# Altium integrated library Weidmueller_OMNIMATE_Signal.IntLib: 2550 symbols (part 23 of 45) (continued)
## 1797240000_Single (continued)
OMNIMATE Signal - series BL/SL 5.00; PartNumber: 1797240000; Manufacturer: Weidmueller; Short_text_for_material: SL-SMT 5.00/03/90LF 1.5SN BK BX; Side_termination_characteristic: Solder flange; Mounting_onto_the_PCB: Reflow solder connection; Pitch_mm: 5 mm; Pitch_inch: 0.197 inch; No_of_poles: 3; Outgoing_elbow: 90°; Solder_pin_length_mm: 1.5 mm; Contact_surface: tinned; Insulating_material: LCP GF; UL_94_flammability_rating: V-0; Rated_voltage_for_surge_voltage_class_pollution_degree_II_2: 400 V; Rated_current_min_no_of_poles_TU_20_deg_C: 19 A; Rated_voltage_use_group_B_UL_1059: 300 V; Rated_current_use_group_B_UL_1059: 15 A; PackageReference: SL_SMT_5_00_90LF_03; Colour: Black; Packaging: Box; Qty: 100 PCS; Revision: V1; ComponentLink1Description: Manufacturer URL; ComponentLink1URL: http://www.weidmueller.com/; ComponentLink2Description: URL Link1; ComponentLink2URL: http://catalog.weidmueller.com/catalog/Start.do?localeId=en&ObjectID=1797240000
footprint SL_SMT_5_00_90LF_03 (OMNIMATE Signal - Serie BL/SL 5.00  SL-SMT 5.00/03/90LF 3.2)
part A pins: A1
part B pins: A2
part C pins: A3

## 1797250000
designator J?
OMNIMATE Signal - series BL/SL 5.00; PartNumber: 1797250000; Manufacturer: Weidmueller; Short_text_for_material: SL-SMT 5.00/04/90LF 1.5SN BK BX; Side_termination_characteristic: Solder flange; Mounting_onto_the_PCB: Reflow solder connection; Pitch_mm: 5 mm; Pitch_inch: 0.197 inch; No_of_poles: 4; Outgoing_elbow: 90°; Solder_pin_length_mm: 1.5 mm; Contact_surface: tinned; Insulating_material: LCP GF; UL_94_flammability_rating: V-0; Rated_voltage_for_surge_voltage_class_pollution_degree_II_2: 400 V; Rated_current_min_no_of_poles_TU_20_deg_C: 19 A; Rated_voltage_use_group_B_UL_1059: 300 V; Rated_current_use_group_B_UL_1059: 15 A; PackageReference: SL_SMT_5_00_90LF_04; Colour: Black; Packaging: Box; Qty: 100 PCS; Revision: V1; ComponentLink1Description: Manufacturer URL; ComponentLink1URL: http://www.weidmueller.com/; ComponentLink2Description: URL Link1; ComponentLink2URL: http://catalog.weidmueller.com/catalog/Start.do?localeId=en&ObjectID=1797250000
footprint SL_SMT_5_00_90LF_04 (OMNIMATE Signal - Serie BL/SL 5.00  SL-SMT 5.00/04/90LF 3.2)
pins: A1, A2, A3, A4

## 1797250000_Single
designator J?
OMNIMATE Signal - series BL/SL 5.00; PartNumber: 1797250000; Manufacturer: Weidmueller; Short_text_for_material: SL-SMT 5.00/04/90LF 1.5SN BK BX; Side_termination_characteristic: Solder flange; Mounting_onto_the_PCB: Reflow solder connection; Pitch_mm: 5 mm; Pitch_inch: 0.197 inch; No_of_poles: 4; Outgoing_elbow: 90°; Solder_pin_length_mm: 1.5 mm; Contact_surface: tinned; Insulating_material: LCP GF; UL_94_flammability_rating: V-0; Rated_voltage_for_surge_voltage_class_pollution_degree_II_2: 400 V; Rated_current_min_no_of_poles_TU_20_deg_C: 19 A; Rated_voltage_use_group_B_UL_1059: 300 V; Rated_current_use_group_B_UL_1059: 15 A; PackageReference: SL_SMT_5_00_90LF_04; Colour: Black; Packaging: Box; Qty: 100 PCS; Revision: V1; ComponentLink1Description: Manufacturer URL; ComponentLink1URL: http://www.weidmueller.com/; ComponentLink2Description: URL Link1; ComponentLink2URL: http://catalog.weidmueller.com/catalog/Start.do?localeId=en&ObjectID=1797250000
footprint SL_SMT_5_00_90LF_04 (OMNIMATE Signal - Serie BL/SL 5.00  SL-SMT 5.00/04/90LF 3.2)
part A pins: A1
part B pins: A2
part C pins: A3
part D pins: A4

## 1797290000
designator J?
OMNIMATE Signal - series BL/SL 5.00; PartNumber: 1797290000; Manufacturer: Weidmueller; Short_text_for_material: SL-SMT 5.00/08/90LF 1.5SN BK BX; Side_termination_characteristic: Solder flange; Mounting_onto_the_PCB: Reflow solder connection; Pitch_mm: 5 mm; Pitch_inch: 0.197 inch; No_of_poles: 8; Outgoing_elbow: 90°; Solder_pin_length_mm: 1.5 mm; Contact_surface: tinned; Insulating_material: LCP GF; UL_94_flammability_rating: V-0; Rated_voltage_for_surge_voltage_class_pollution_degree_II_2: 400 V; Rated_current_min_no_of_poles_TU_20_deg_C: 19 A; Rated_voltage_use_group_B_UL_1059: 300 V; Rated_current_use_group_B_UL_1059: 15 A; PackageReference: SL_SMT_5_00_90LF_08; Colour: Black; Packaging: Box; Qty: 50 PCS; Revision: V1; ComponentLink1Description: Manufacturer URL; ComponentLink1URL: http://www.weidmueller.com/; ComponentLink2Description: URL Link1; ComponentLink2URL: http://catalog.weidmueller.com/catalog/Start.do?localeId=en&ObjectID=1797290000
footprint SL_SMT_5_00_90LF_08 (OMNIMATE Signal - Serie BL/SL 5.00  SL-SMT 5.00/08/90LF 3.2)
pins: A1, A2, A3, A4, A5, A6, A7, A8

## 1797290000_Single
designator J?
OMNIMATE Signal - series BL/SL 5.00; PartNumber: 1797290000; Manufacturer: Weidmueller; Short_text_for_material: SL-SMT 5.00/08/90LF 1.5SN BK BX; Side_termination_characteristic: Solder flange; Mounting_onto_the_PCB: Reflow solder connection; Pitch_mm: 5 mm; Pitch_inch: 0.197 inch; No_of_poles: 8; Outgoing_elbow: 90°; Solder_pin_length_mm: 1.5 mm; Contact_surface: tinned; Insulating_material: LCP GF; UL_94_flammability_rating: V-0; Rated_voltage_for_surge_voltage_class_pollution_degree_II_2: 400 V; Rated_current_min_no_of_poles_TU_20_deg_C: 19 A; Rated_voltage_use_group_B_UL_1059: 300 V; Rated_current_use_group_B_UL_1059: 15 A; PackageReference: SL_SMT_5_00_90LF_08; Colour: Black; Packaging: Box; Qty: 50 PCS; Revision: V1; ComponentLink1Description: Manufacturer URL; ComponentLink1URL: http://www.weidmueller.com/; ComponentLink2Description: URL Link1; ComponentLink2URL: http://catalog.weidmueller.com/catalog/Start.do?localeId=en&ObjectID=1797290000
footprint SL_SMT_5_00_90LF_08 (OMNIMATE Signal - Serie BL/SL 5.00  SL-SMT 5.00/08/90LF 3.2)
part A pins: A1
part B pins: A2
part C pins: A3
part D pins: A4
part E pins: A5
part F pins: A6
part G pins: A7
part H pins: A8

## 1797620000
designator J?
OMNIMATE Signal - series BL/SL 5.00; PartNumber: 1797620000; Manufacturer: Weidmueller; Short_text_for_material: SL-SMT 5.00/02/90 1.5SN BK RL; Side_termination_characteristic: open side; Mounting_onto_the_PCB: Reflow solder connection; Pitch_mm: 5 mm; Pitch_inch: 0.197 inch; No_of_poles: 2; Outgoing_elbow: 90°; Solder_pin_length_mm: 1.5 mm; Contact_surface: tinned; Insulating_material: LCP GF; UL_94_flammability_rating: V-0; Rated_voltage_for_surge_voltage_class_pollution_degree_II_2: 400 V; Rated_current_min_no_of_poles_TU_20_deg_C: 19 A; Rated_voltage_use_group_B_UL_1059: 300 V; Rated_current_use_group_B_UL_1059: 15 A; PackageReference: SL_SMT_5_00_90_02; Colour: Black; Packaging: Tape; Qty: 350 PCS; Revision: V1; ComponentLink1Description: Manufacturer URL; ComponentLink1URL: http://www.weidmueller.com/; ComponentLink2Description: URL Link1; ComponentLink2URL: http://catalog.weidmueller.com/catalog/Start.do?localeId=en&ObjectID=1797620000
footprint SL_SMT_5_00_90_02 (OMNIMATE Signal - Serie BL/SL 5.00  SL-SMT 5.00/02/90 3.2)
pins: A1, A2

## 1797620000_Single
designator J?
OMNIMATE Signal - series BL/SL 5.00; PartNumber: 1797620000; Manufacturer: Weidmueller; Short_text_for_material: SL-SMT 5.00/02/90 1.5SN BK RL; Side_termination_characteristic: open side; Mounting_onto_the_PCB: Reflow solder connection; Pitch_mm: 5 mm; Pitch_inch: 0.197 inch; No_of_poles: 2; Outgoing_elbow: 90°; Solder_pin_length_mm: 1.5 mm; Contact_surface: tinned; Insulating_material: LCP GF; UL_94_flammability_rating: V-0; Rated_voltage_for_surge_voltage_class_pollution_degree_II_2: 400 V; Rated_current_min_no_of_poles_TU_20_deg_C: 19 A; Rated_voltage_use_group_B_UL_1059: 300 V; Rated_current_use_group_B_UL_1059: 15 A; PackageReference: SL_SMT_5_00_90_02; Colour: Black; Packaging: Tape; Qty: 350 PCS; Revision: V1; ComponentLink1Description: Manufacturer URL; ComponentLink1URL: http://www.weidmueller.com/; ComponentLink2Description: URL Link1; ComponentLink2URL: http://catalog.weidmueller.com/catalog/Start.do?localeId=en&ObjectID=1797620000
footprint SL_SMT_5_00_90_02 (OMNIMATE Signal - Serie BL/SL 5.00  SL-SMT 5.00/02/90 3.2)
part A pins: A1
part B pins: A2

## 1797630000
designator J?
OMNIMATE Signal - series BL/SL 5.00; PartNumber: 1797630000; Manufacturer: Weidmueller; Short_text_for_material: SL-SMT 5.00/03/90 1.5SN BK RL; Side_termination_characteristic: open side; Mounting_onto_the_PCB: Reflow solder connection; Pitch_mm: 5 mm; Pitch_inch: 0.197 inch; No_of_poles: 3; Outgoing_elbow: 90°; Solder_pin_length_mm: 1.5 mm; Contact_surface: tinned; Insulating_material: LCP GF; UL_94_flammability_rating: V-0; Rated_voltage_for_surge_voltage_class_pollution_degree_II_2: 400 V; Rated_current_min_no_of_poles_TU_20_deg_C: 19 A; Rated_voltage_use_group_B_UL_1059: 300 V; Rated_current_use_group_B_UL_1059: 15 A; PackageReference: SL_SMT_5_00_90_03; Colour: Black; Packaging: Tape; Qty: 350 PCS; Revision: V1; ComponentLink1Description: Manufacturer URL; ComponentLink1URL: http://www.weidmueller.com/; ComponentLink2Description: URL Link1; ComponentLink2URL: http://catalog.weidmueller.com/catalog/Start.do?localeId=en&ObjectID=1797630000
footprint SL_SMT_5_00_90_03 (OMNIMATE Signal - Serie BL/SL 5.00  SL-SMT 5.00/03/90 3.2)
pins: A1, A2, A3

## 1797630000_Single
designator J?
OMNIMATE Signal - series BL/SL 5.00; PartNumber: 1797630000; Manufacturer: Weidmueller; Short_text_for_material: SL-SMT 5.00/03/90 1.5SN BK RL; Side_termination_characteristic: open side; Mounting_onto_the_PCB: Reflow solder connection; Pitch_mm: 5 mm; Pitch_inch: 0.197 inch; No_of_poles: 3; Outgoing_elbow: 90°; Solder_pin_length_mm: 1.5 mm; Contact_surface: tinned; Insulating_material: LCP GF; UL_94_flammability_rating: V-0; Rated_voltage_for_surge_voltage_class_pollution_degree_II_2: 400 V; Rated_current_min_no_of_poles_TU_20_deg_C: 19 A; Rated_voltage_use_group_B_UL_1059: 300 V; Rated_current_use_group_B_UL_1059: 15 A; PackageReference: SL_SMT_5_00_90_03; Colour: Black; Packaging: Tape; Qty: 350 PCS; Revision: V1; ComponentLink1Description: Manufacturer URL; ComponentLink1URL: http://www.weidmueller.com/; ComponentLink2Description: URL Link1; ComponentLink2URL: http://catalog.weidmueller.com/catalog/Start.do?localeId=en&ObjectID=1797630000
footprint SL_SMT_5_00_90_03 (OMNIMATE Signal - Serie BL/SL 5.00  SL-SMT 5.00/03/90 3.2)
part A pins: A1
part B pins: A2
part C pins: A3

## 1797640000
designator J?
OMNIMATE Signal - series BL/SL 5.00; PartNumber: 1797640000; Manufacturer: Weidmueller; Short_text_for_material: SL-SMT 5.00/04/90 1.5SN BK RL; Side_termination_characteristic: open side; Mounting_onto_the_PCB: Reflow solder connection; Pitch_mm: 5 mm; Pitch_inch: 0.197 inch; No_of_poles: 4; Outgoing_elbow: 90°; Solder_pin_length_mm: 1.5 mm; Contact_surface: tinned; Insulating_material: LCP GF; UL_94_flammability_rating: V-0; Rated_voltage_for_surge_voltage_class_pollution_degree_II_2: 400 V; Rated_current_min_no_of_poles_TU_20_deg_C: 19 A; Rated_voltage_use_group_B_UL_1059: 300 V; Rated_current_use_group_B_UL_1059: 15 A; PackageReference: SL_SMT_5_00_90_04; Colour: Black; Packaging: Tape; Qty: 350 PCS; Revision: V1; ComponentLink1Description: Manufacturer URL; ComponentLink1URL: http://www.weidmueller.com/; ComponentLink2Description: URL Link1; ComponentLink2URL: http://catalog.weidmueller.com/catalog/Start.do?localeId=en&ObjectID=1797640000
footprint SL_SMT_5_00_90_04 (OMNIMATE Signal - Serie BL/SL 5.00  SL-SMT 5.00/04/90 3.2)
pins: A1, A2, A3, A4

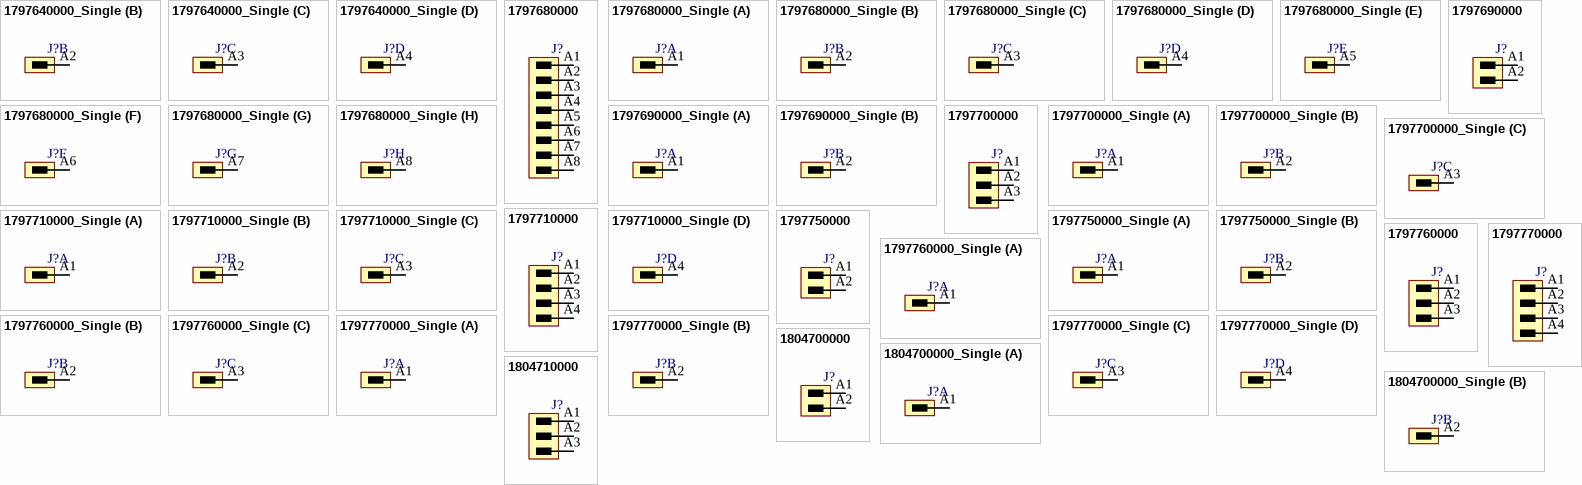
[diagram p124: symbols 1797640000_Single to 1804710000]

## 1797640000_Single
designator J?
OMNIMATE Signal - series BL/SL 5.00; PartNumber: 1797640000; Manufacturer: Weidmueller; Short_text_for_material: SL-SMT 5.00/04/90 1.5SN BK RL; Side_termination_characteristic: open side; Mounting_onto_the_PCB: Reflow solder connection; Pitch_mm: 5 mm; Pitch_inch: 0.197 inch; No_of_poles: 4; Outgoing_elbow: 90°; Solder_pin_length_mm: 1.5 mm; Contact_surface: tinned; Insulating_material: LCP GF; UL_94_flammability_rating: V-0; Rated_voltage_for_surge_voltage_class_pollution_degree_II_2: 400 V; Rated_current_min_no_of_poles_TU_20_deg_C: 19 A; Rated_voltage_use_group_B_UL_1059: 300 V; Rated_current_use_group_B_UL_1059: 15 A; PackageReference: SL_SMT_5_00_90_04; Colour: Black; Packaging: Tape; Qty: 350 PCS; Revision: V1; ComponentLink1Description: Manufacturer URL; ComponentLink1URL: http://www.weidmueller.com/; ComponentLink2Description: URL Link1; ComponentLink2URL: http://catalog.weidmueller.com/catalog/Start.do?localeId=en&ObjectID=1797640000
footprint SL_SMT_5_00_90_04 (OMNIMATE Signal - Serie BL/SL 5.00  SL-SMT 5.00/04/90 3.2)
part A pins: A1
part B pins: A2
part C pins: A3
part D pins: A4

## 1797680000
designator J?
OMNIMATE Signal - series BL/SL 5.00; PartNumber: 1797680000; Manufacturer: Weidmueller; Short_text_for_material: SL-SMT 5.00/08/90 1.5SN BK RL; Side_termination_characteristic: open side; Mounting_onto_the_PCB: Reflow solder connection; Pitch_mm: 5 mm; Pitch_inch: 0.197 inch; No_of_poles: 8; Outgoing_elbow: 90°; Solder_pin_length_mm: 1.5 mm; Contact_surface: tinned; Insulating_material: LCP GF; UL_94_flammability_rating: V-0; Rated_voltage_for_surge_voltage_class_pollution_degree_II_2: 400 V; Rated_current_min_no_of_poles_TU_20_deg_C: 19 A; Rated_voltage_use_group_B_UL_1059: 300 V; Rated_current_use_group_B_UL_1059: 15 A; PackageReference: SL_SMT_5_00_90_08; Colour: Black; Packaging: Tape; Qty: 350 PCS; Revision: V1; ComponentLink1Description: Manufacturer URL; ComponentLink1URL: http://www.weidmueller.com/; ComponentLink2Description: URL Link1; ComponentLink2URL: http://catalog.weidmueller.com/catalog/Start.do?localeId=en&ObjectID=1797680000
footprint SL_SMT_5_00_90_08 (OMNIMATE Signal - Serie BL/SL 5.00  SL-SMT 5.00/08/90 3.2)
pins: A1, A2, A3, A4, A5, A6, A7, A8

## 1797680000_Single
designator J?
OMNIMATE Signal - series BL/SL 5.00; PartNumber: 1797680000; Manufacturer: Weidmueller; Short_text_for_material: SL-SMT 5.00/08/90 1.5SN BK RL; Side_termination_characteristic: open side; Mounting_onto_the_PCB: Reflow solder connection; Pitch_mm: 5 mm; Pitch_inch: 0.197 inch; No_of_poles: 8; Outgoing_elbow: 90°; Solder_pin_length_mm: 1.5 mm; Contact_surface: tinned; Insulating_material: LCP GF; UL_94_flammability_rating: V-0; Rated_voltage_for_surge_voltage_class_pollution_degree_II_2: 400 V; Rated_current_min_no_of_poles_TU_20_deg_C: 19 A; Rated_voltage_use_group_B_UL_1059: 300 V; Rated_current_use_group_B_UL_1059: 15 A; PackageReference: SL_SMT_5_00_90_08; Colour: Black; Packaging: Tape; Qty: 350 PCS; Revision: V1; ComponentLink1Description: Manufacturer URL; ComponentLink1URL: http://www.weidmueller.com/; ComponentLink2Description: URL Link1; ComponentLink2URL: http://catalog.weidmueller.com/catalog/Start.do?localeId=en&ObjectID=1797680000
footprint SL_SMT_5_00_90_08 (OMNIMATE Signal - Serie BL/SL 5.00  SL-SMT 5.00/08/90 3.2)
part A pins: A1
part B pins: A2
part C pins: A3
part D pins: A4
part E pins: A5
part F pins: A6
part G pins: A7
part H pins: A8

## 1797690000
designator J?
OMNIMATE Signal - series BL/SL 5.00; PartNumber: 1797690000; Manufacturer: Weidmueller; Short_text_for_material: SL-SMT 5.00/02/90G 1.5SN BK RL; Side_termination_characteristic: closed side; Mounting_onto_the_PCB: Reflow solder connection; Pitch_mm: 5 mm; Pitch_inch: 0.197 inch; No_of_poles: 2; Outgoing_elbow: 90°; Solder_pin_length_mm: 1.5 mm; Contact_surface: tinned; Insulating_material: LCP GF; UL_94_flammability_rating: V-0; Rated_voltage_for_surge_voltage_class_pollution_degree_II_2: 400 V; Rated_current_min_no_of_poles_TU_20_deg_C: 19 A; Rated_voltage_use_group_B_UL_1059: 300 V; Rated_current_use_group_B_UL_1059: 15 A; PackageReference: SL_SMT_5_00_90G_02; Colour: Black; Packaging: Tape; Qty: 350 PCS; Revision: V1; ComponentLink1Description: Manufacturer URL; ComponentLink1URL: http://www.weidmueller.com/; ComponentLink2Description: URL Link1; ComponentLink2URL: http://catalog.weidmueller.com/catalog/Start.do?localeId=en&ObjectID=1797690000
footprint SL_SMT_5_00_90G_02 (OMNIMATE Signal - Serie BL/SL 5.00  SL-SMT 5.00/02/90G 3.2)
pins: A1, A2

## 1797690000_Single
designator J?
OMNIMATE Signal - series BL/SL 5.00; PartNumber: 1797690000; Manufacturer: Weidmueller; Short_text_for_material: SL-SMT 5.00/02/90G 1.5SN BK RL; Side_termination_characteristic: closed side; Mounting_onto_the_PCB: Reflow solder connection; Pitch_mm: 5 mm; Pitch_inch: 0.197 inch; No_of_poles: 2; Outgoing_elbow: 90°; Solder_pin_length_mm: 1.5 mm; Contact_surface: tinned; Insulating_material: LCP GF; UL_94_flammability_rating: V-0; Rated_voltage_for_surge_voltage_class_pollution_degree_II_2: 400 V; Rated_current_min_no_of_poles_TU_20_deg_C: 19 A; Rated_voltage_use_group_B_UL_1059: 300 V; Rated_current_use_group_B_UL_1059: 15 A; PackageReference: SL_SMT_5_00_90G_02; Colour: Black; Packaging: Tape; Qty: 350 PCS; Revision: V1; ComponentLink1Description: Manufacturer URL; ComponentLink1URL: http://www.weidmueller.com/; ComponentLink2Description: URL Link1; ComponentLink2URL: http://catalog.weidmueller.com/catalog/Start.do?localeId=en&ObjectID=1797690000
footprint SL_SMT_5_00_90G_02 (OMNIMATE Signal - Serie BL/SL 5.00  SL-SMT 5.00/02/90G 3.2)
part A pins: A1
part B pins: A2

## 1797700000
designator J?
OMNIMATE Signal - series BL/SL 5.00; PartNumber: 1797700000; Manufacturer: Weidmueller; Short_text_for_material: SL-SMT 5.00/03/90G 1.5SN BK RL; Side_termination_characteristic: closed side; Mounting_onto_the_PCB: Reflow solder connection; Pitch_mm: 5 mm; Pitch_inch: 0.197 inch; No_of_poles: 3; Outgoing_elbow: 90°; Solder_pin_length_mm: 1.5 mm; Contact_surface: tinned; Insulating_material: LCP GF; UL_94_flammability_rating: V-0; Rated_voltage_for_surge_voltage_class_pollution_degree_II_2: 400 V; Rated_current_min_no_of_poles_TU_20_deg_C: 19 A; Rated_voltage_use_group_B_UL_1059: 300 V; Rated_current_use_group_B_UL_1059: 15 A; PackageReference: SL_SMT_5_00_90G_03; Colour: Black; Packaging: Tape; Qty: 350 PCS; Revision: V1; ComponentLink1Description: Manufacturer URL; ComponentLink1URL: http://www.weidmueller.com/; ComponentLink2Description: URL Link1; ComponentLink2URL: http://catalog.weidmueller.com/catalog/Start.do?localeId=en&ObjectID=1797700000
footprint SL_SMT_5_00_90G_03 (OMNIMATE Signal - Serie BL/SL 5.00  SL-SMT 5.00/03/90G 3.2)
pins: A1, A2, A3

## 1797700000_Single
designator J?
OMNIMATE Signal - series BL/SL 5.00; PartNumber: 1797700000; Manufacturer: Weidmueller; Short_text_for_material: SL-SMT 5.00/03/90G 1.5SN BK RL; Side_termination_characteristic: closed side; Mounting_onto_the_PCB: Reflow solder connection; Pitch_mm: 5 mm; Pitch_inch: 0.197 inch; No_of_poles: 3; Outgoing_elbow: 90°; Solder_pin_length_mm: 1.5 mm; Contact_surface: tinned; Insulating_material: LCP GF; UL_94_flammability_rating: V-0; Rated_voltage_for_surge_voltage_class_pollution_degree_II_2: 400 V; Rated_current_min_no_of_poles_TU_20_deg_C: 19 A; Rated_voltage_use_group_B_UL_1059: 300 V; Rated_current_use_group_B_UL_1059: 15 A; PackageReference: SL_SMT_5_00_90G_03; Colour: Black; Packaging: Tape; Qty: 350 PCS; Revision: V1; ComponentLink1Description: Manufacturer URL; ComponentLink1URL: http://www.weidmueller.com/; ComponentLink2Description: URL Link1; ComponentLink2URL: http://catalog.weidmueller.com/catalog/Start.do?localeId=en&ObjectID=1797700000
footprint SL_SMT_5_00_90G_03 (OMNIMATE Signal - Serie BL/SL 5.00  SL-SMT 5.00/03/90G 3.2)
part A pins: A1
part B pins: A2
part C pins: A3

## 1797710000
designator J?
OMNIMATE Signal - series BL/SL 5.00; PartNumber: 1797710000; Manufacturer: Weidmueller; Short_text_for_material: SL-SMT 5.00/04/90G 1.5SN BK RL; Side_termination_characteristic: closed side; Mounting_onto_the_PCB: Reflow solder connection; Pitch_mm: 5 mm; Pitch_inch: 0.197 inch; No_of_poles: 4; Outgoing_elbow: 90°; Solder_pin_length_mm: 1.5 mm; Contact_surface: tinned; Insulating_material: LCP GF; UL_94_flammability_rating: V-0; Rated_voltage_for_surge_voltage_class_pollution_degree_II_2: 400 V; Rated_current_min_no_of_poles_TU_20_deg_C: 19 A; Rated_voltage_use_group_B_UL_1059: 300 V; Rated_current_use_group_B_UL_1059: 15 A; PackageReference: SL_SMT_5_00_90G_04; Colour: Black; Packaging: Tape; Qty: 350 PCS; Revision: V1; ComponentLink1Description: Manufacturer URL; ComponentLink1URL: http://www.weidmueller.com/; ComponentLink2Description: URL Link1; ComponentLink2URL: http://catalog.weidmueller.com/catalog/Start.do?localeId=en&ObjectID=1797710000
footprint SL_SMT_5_00_90G_04 (OMNIMATE Signal - Serie BL/SL 5.00  SL-SMT 5.00/04/90G 3.2)
pins: A1, A2, A3, A4

## 1797710000_Single
designator J?
OMNIMATE Signal - series BL/SL 5.00; PartNumber: 1797710000; Manufacturer: Weidmueller; Short_text_for_material: SL-SMT 5.00/04/90G 1.5SN BK RL; Side_termination_characteristic: closed side; Mounting_onto_the_PCB: Reflow solder connection; Pitch_mm: 5 mm; Pitch_inch: 0.197 inch; No_of_poles: 4; Outgoing_elbow: 90°; Solder_pin_length_mm: 1.5 mm; Contact_surface: tinned; Insulating_material: LCP GF; UL_94_flammability_rating: V-0; Rated_voltage_for_surge_voltage_class_pollution_degree_II_2: 400 V; Rated_current_min_no_of_poles_TU_20_deg_C: 19 A; Rated_voltage_use_group_B_UL_1059: 300 V; Rated_current_use_group_B_UL_1059: 15 A; PackageReference: SL_SMT_5_00_90G_04; Colour: Black; Packaging: Tape; Qty: 350 PCS; Revision: V1; ComponentLink1Description: Manufacturer URL; ComponentLink1URL: http://www.weidmueller.com/; ComponentLink2Description: URL Link1; ComponentLink2URL: http://catalog.weidmueller.com/catalog/Start.do?localeId=en&ObjectID=1797710000
footprint SL_SMT_5_00_90G_04 (OMNIMATE Signal - Serie BL/SL 5.00  SL-SMT 5.00/04/90G 3.2)
part A pins: A1
part B pins: A2
part C pins: A3
part D pins: A4

## 1797750000
designator J?
OMNIMATE Signal - series BL/SL 5.00; PartNumber: 1797750000; Manufacturer: Weidmueller; Short_text_for_material: SL-SMT 5.00/02/90LF 1.5SN BK RL; Side_termination_characteristic: Solder flange; Mounting_onto_the_PCB: Reflow solder connection; Pitch_mm: 5 mm; Pitch_inch: 0.197 inch; No_of_poles: 2; Outgoing_elbow: 90°; Solder_pin_length_mm: 1.5 mm; Contact_surface: tinned; Insulating_material: LCP GF; UL_94_flammability_rating: V-0; Rated_voltage_for_surge_voltage_class_pollution_degree_II_2: 400 V; Rated_current_min_no_of_poles_TU_20_deg_C: 19 A; Rated_voltage_use_group_B_UL_1059: 300 V; Rated_current_use_group_B_UL_1059: 15 A; PackageReference: SL_SMT_5_00_90LF_02; Colour: Black; Packaging: Tape; Qty: 350 PCS; Revision: V1; ComponentLink1Description: Manufacturer URL; ComponentLink1URL: http://www.weidmueller.com/; ComponentLink2Description: URL Link1; ComponentLink2URL: http://catalog.weidmueller.com/catalog/Start.do?localeId=en&ObjectID=1797750000
footprint SL_SMT_5_00_90LF_02 (OMNIMATE Signal - Serie BL/SL 5.00  SL-SMT 5.00/02/90LF 3.2)
pins: A1, A2

## 1797750000_Single
designator J?
OMNIMATE Signal - series BL/SL 5.00; PartNumber: 1797750000; Manufacturer: Weidmueller; Short_text_for_material: SL-SMT 5.00/02/90LF 1.5SN BK RL; Side_termination_characteristic: Solder flange; Mounting_onto_the_PCB: Reflow solder connection; Pitch_mm: 5 mm; Pitch_inch: 0.197 inch; No_of_poles: 2; Outgoing_elbow: 90°; Solder_pin_length_mm: 1.5 mm; Contact_surface: tinned; Insulating_material: LCP GF; UL_94_flammability_rating: V-0; Rated_voltage_for_surge_voltage_class_pollution_degree_II_2: 400 V; Rated_current_min_no_of_poles_TU_20_deg_C: 19 A; Rated_voltage_use_group_B_UL_1059: 300 V; Rated_current_use_group_B_UL_1059: 15 A; PackageReference: SL_SMT_5_00_90LF_02; Colour: Black; Packaging: Tape; Qty: 350 PCS; Revision: V1; ComponentLink1Description: Manufacturer URL; ComponentLink1URL: http://www.weidmueller.com/; ComponentLink2Description: URL Link1; ComponentLink2URL: http://catalog.weidmueller.com/catalog/Start.do?localeId=en&ObjectID=1797750000
footprint SL_SMT_5_00_90LF_02 (OMNIMATE Signal - Serie BL/SL 5.00  SL-SMT 5.00/02/90LF 3.2)
part A pins: A1
part B pins: A2

## 1797760000
designator J?
OMNIMATE Signal - series BL/SL 5.00; PartNumber: 1797760000; Manufacturer: Weidmueller; Short_text_for_material: SL-SMT 5.00/03/90LF 1.5SN BK RL; Side_termination_characteristic: Solder flange; Mounting_onto_the_PCB: Reflow solder connection; Pitch_mm: 5 mm; Pitch_inch: 0.197 inch; No_of_poles: 3; Outgoing_elbow: 90°; Solder_pin_length_mm: 1.5 mm; Contact_surface: tinned; Insulating_material: LCP GF; UL_94_flammability_rating: V-0; Rated_voltage_for_surge_voltage_class_pollution_degree_II_2: 400 V; Rated_current_min_no_of_poles_TU_20_deg_C: 19 A; Rated_voltage_use_group_B_UL_1059: 300 V; Rated_current_use_group_B_UL_1059: 15 A; PackageReference: SL_SMT_5_00_90LF_03; Colour: Black; Packaging: Tape; Qty: 350 PCS; Revision: V1; ComponentLink1Description: Manufacturer URL; ComponentLink1URL: http://www.weidmueller.com/; ComponentLink2Description: URL Link1; ComponentLink2URL: http://catalog.weidmueller.com/catalog/Start.do?localeId=en&ObjectID=1797760000
footprint SL_SMT_5_00_90LF_03 (OMNIMATE Signal - Serie BL/SL 5.00  SL-SMT 5.00/03/90LF 3.2)
pins: A1, A2, A3

## 1797760000_Single
designator J?
OMNIMATE Signal - series BL/SL 5.00; PartNumber: 1797760000; Manufacturer: Weidmueller; Short_text_for_material: SL-SMT 5.00/03/90LF 1.5SN BK RL; Side_termination_characteristic: Solder flange; Mounting_onto_the_PCB: Reflow solder connection; Pitch_mm: 5 mm; Pitch_inch: 0.197 inch; No_of_poles: 3; Outgoing_elbow: 90°; Solder_pin_length_mm: 1.5 mm; Contact_surface: tinned; Insulating_material: LCP GF; UL_94_flammability_rating: V-0; Rated_voltage_for_surge_voltage_class_pollution_degree_II_2: 400 V; Rated_current_min_no_of_poles_TU_20_deg_C: 19 A; Rated_voltage_use_group_B_UL_1059: 300 V; Rated_current_use_group_B_UL_1059: 15 A; PackageReference: SL_SMT_5_00_90LF_03; Colour: Black; Packaging: Tape; Qty: 350 PCS; Revision: V1; ComponentLink1Description: Manufacturer URL; ComponentLink1URL: http://www.weidmueller.com/; ComponentLink2Description: URL Link1; ComponentLink2URL: http://catalog.weidmueller.com/catalog/Start.do?localeId=en&ObjectID=1797760000
footprint SL_SMT_5_00_90LF_03 (OMNIMATE Signal - Serie BL/SL 5.00  SL-SMT 5.00/03/90LF 3.2)
part A pins: A1
part B pins: A2
part C pins: A3

## 1797770000
designator J?
OMNIMATE Signal - series BL/SL 5.00; PartNumber: 1797770000; Manufacturer: Weidmueller; Short_text_for_material: SL-SMT 5.00/04/90LF 1.5SN BK RL; Side_termination_characteristic: Solder flange; Mounting_onto_the_PCB: Reflow solder connection; Pitch_mm: 5 mm; Pitch_inch: 0.197 inch; No_of_poles: 4; Outgoing_elbow: 90°; Solder_pin_length_mm: 1.5 mm; Contact_surface: tinned; Insulating_material: LCP GF; UL_94_flammability_rating: V-0; Rated_voltage_for_surge_voltage_class_pollution_degree_II_2: 400 V; Rated_current_min_no_of_poles_TU_20_deg_C: 19 A; Rated_voltage_use_group_B_UL_1059: 300 V; Rated_current_use_group_B_UL_1059: 15 A; PackageReference: SL_SMT_5_00_90LF_04; Colour: Black; Packaging: Tape; Qty: 350 PCS; Revision: V1; ComponentLink1Description: Manufacturer URL; ComponentLink1URL: http://www.weidmueller.com/; ComponentLink2Description: URL Link1; ComponentLink2URL: http://catalog.weidmueller.com/catalog/Start.do?localeId=en&ObjectID=1797770000
footprint SL_SMT_5_00_90LF_04 (OMNIMATE Signal - Serie BL/SL 5.00  SL-SMT 5.00/04/90LF 3.2)
pins: A1, A2, A3, A4

## 1797770000_Single
designator J?
OMNIMATE Signal - series BL/SL 5.00; PartNumber: 1797770000; Manufacturer: Weidmueller; Short_text_for_material: SL-SMT 5.00/04/90LF 1.5SN BK RL; Side_termination_characteristic: Solder flange; Mounting_onto_the_PCB: Reflow solder connection; Pitch_mm: 5 mm; Pitch_inch: 0.197 inch; No_of_poles: 4; Outgoing_elbow: 90°; Solder_pin_length_mm: 1.5 mm; Contact_surface: tinned; Insulating_material: LCP GF; UL_94_flammability_rating: V-0; Rated_voltage_for_surge_voltage_class_pollution_degree_II_2: 400 V; Rated_current_min_no_of_poles_TU_20_deg_C: 19 A; Rated_voltage_use_group_B_UL_1059: 300 V; Rated_current_use_group_B_UL_1059: 15 A; PackageReference: SL_SMT_5_00_90LF_04; Colour: Black; Packaging: Tape; Qty: 350 PCS; Revision: V1; ComponentLink1Description: Manufacturer URL; ComponentLink1URL: http://www.weidmueller.com/; ComponentLink2Description: URL Link1; ComponentLink2URL: http://catalog.weidmueller.com/catalog/Start.do?localeId=en&ObjectID=1797770000
footprint SL_SMT_5_00_90LF_04 (OMNIMATE Signal - Serie BL/SL 5.00  SL-SMT 5.00/04/90LF 3.2)
part A pins: A1
part B pins: A2
part C pins: A3
part D pins: A4

## 1804700000
designator J?
OMNIMATE Signal - series BL/SL 3.50; PartNumber: 1804700000; Manufacturer: Weidmueller; Short_text_for_material: SL-SMT 3.50/02/180LF 1.5SN BK BX; Side_termination_characteristic: Solder flange; Mounting_onto_the_PCB: Reflow solder connection; Pitch_mm: 3.5 mm; Pitch_inch: 0.138 inch; No_of_poles: 2; Outgoing_elbow: 180°; Solder_pin_length_mm: 1.5 mm; Contact_material: CuSn; Contact_surface: tinned; Insulating_material: LCP GF; UL_94_flammability_rating: V-0; Rated_voltage_for_surge_voltage_class_pollution_degree_II_2: 320 V; Rated_current_min_no_of_poles_TU_20_deg_C: 19 A; Rated_voltage_use_group_B_UL_1059: 300 V; Rated_current_use_group_B_UL_1059: 10 A; PackageReference: SL_SMT_3_5_180LF_02; Colour: Black; Packaging: Box; Qty: 100 PCS; Revision: V1; ComponentLink1Description: Manufacturer URL; ComponentLink1URL: http://www.weidmueller.com/; ComponentLink2Description: URL Link1; ComponentLink2URL: http://catalog.weidmueller.com/catalog/Start.do?localeId=en&ObjectID=1804700000
footprint SL_SMT_3_5_180LF_02 (OMNIMATE Signal - Serie BL/SL 3.50  SL-SMT 3.50/02/180LF 1.5)
pins: A1, A2

## 1804700000_Single
designator J?
OMNIMATE Signal - series BL/SL 3.50; PartNumber: 1804700000; Manufacturer: Weidmueller; Short_text_for_material: SL-SMT 3.50/02/180LF 1.5SN BK BX; Side_termination_characteristic: Solder flange; Mounting_onto_the_PCB: Reflow solder connection; Pitch_mm: 3.5 mm; Pitch_inch: 0.138 inch; No_of_poles: 2; Outgoing_elbow: 180°; Solder_pin_length_mm: 1.5 mm; Contact_material: CuSn; Contact_surface: tinned; Insulating_material: LCP GF; UL_94_flammability_rating: V-0; Rated_voltage_for_surge_voltage_class_pollution_degree_II_2: 320 V; Rated_current_min_no_of_poles_TU_20_deg_C: 19 A; Rated_voltage_use_group_B_UL_1059: 300 V; Rated_current_use_group_B_UL_1059: 10 A; PackageReference: SL_SMT_3_5_180LF_02; Colour: Black; Packaging: Box; Qty: 100 PCS; Revision: V1; ComponentLink1Description: Manufacturer URL; ComponentLink1URL: http://www.weidmueller.com/; ComponentLink2Description: URL Link1; ComponentLink2URL: http://catalog.weidmueller.com/catalog/Start.do?localeId=en&ObjectID=1804700000
footprint SL_SMT_3_5_180LF_02 (OMNIMATE Signal - Serie BL/SL 3.50  SL-SMT 3.50/02/180LF 1.5)
part A pins: A1
part B pins: A2

## 1804710000
designator J?
OMNIMATE Signal - series BL/SL 3.50; PartNumber: 1804710000; Manufacturer: Weidmueller; Short_text_for_material: SL-SMT 3.50/03/180LF 1.5SN BK BX; Side_termination_characteristic: Solder flange; Mounting_onto_the_PCB: Reflow solder connection; Pitch_mm: 3.5 mm; Pitch_inch: 0.138 inch; No_of_poles: 3; Outgoing_elbow: 180°; Solder_pin_length_mm: 1.5 mm; Contact_material: CuSn; Contact_surface: tinned; Insulating_material: LCP GF; UL_94_flammability_rating: V-0; Rated_voltage_for_surge_voltage_class_pollution_degree_II_2: 320 V; Rated_current_min_no_of_poles_TU_20_deg_C: 19 A; Rated_voltage_use_group_B_UL_1059: 300 V; Rated_current_use_group_B_UL_1059: 10 A; PackageReference: SL_SMT_3_5_180LF_03; Colour: Black; Packaging: Box; Qty: 100 PCS; Revision: V1; ComponentLink1Description: Manufacturer URL; ComponentLink1URL: http://www.weidmueller.com/; ComponentLink2Description: URL Link1; ComponentLink2URL: http://catalog.weidmueller.com/catalog/Start.do?localeId=en&ObjectID=1804710000
footprint SL_SMT_3_5_180LF_03 (OMNIMATE Signal - Serie BL/SL 3.50  SL-SMT 3.50/03/180LF 1.5)
pins: A1, A2, A3

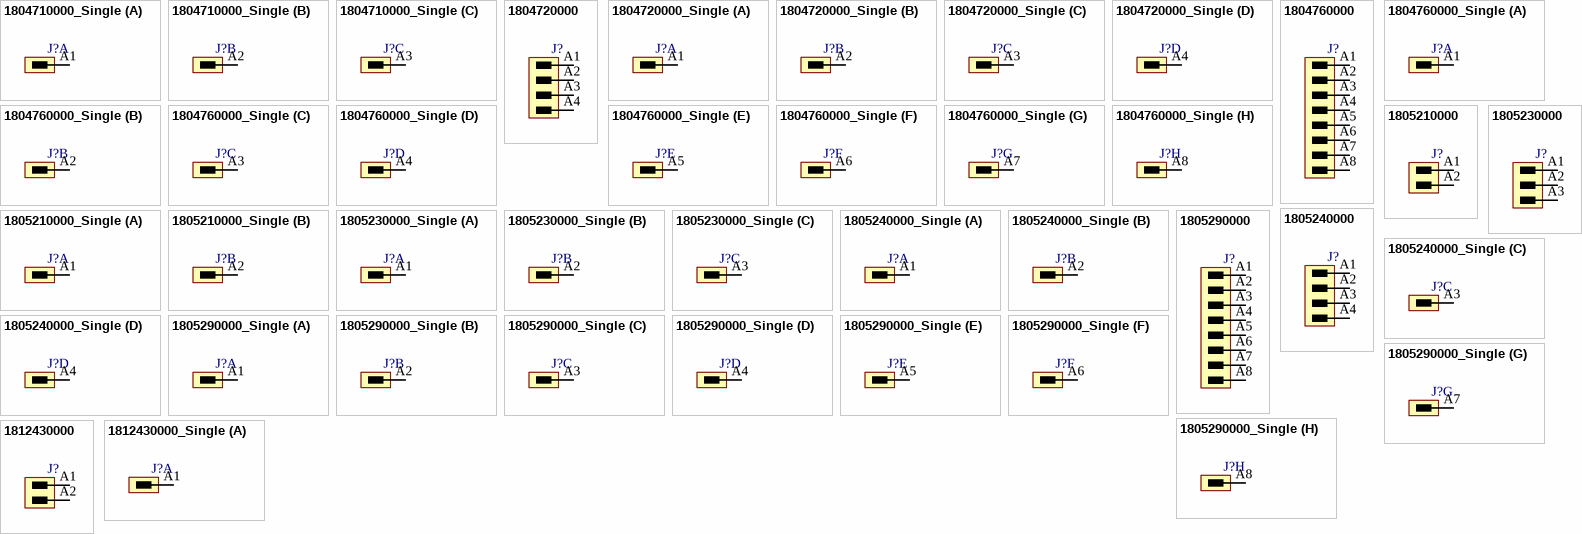
[diagram p125: symbols 1804710000_Single to 1812430000_Single]

## 1804710000_Single
designator J?
OMNIMATE Signal - series BL/SL 3.50; PartNumber: 1804710000; Manufacturer: Weidmueller; Short_text_for_material: SL-SMT 3.50/03/180LF 1.5SN BK BX; Side_termination_characteristic: Solder flange; Mounting_onto_the_PCB: Reflow solder connection; Pitch_mm: 3.5 mm; Pitch_inch: 0.138 inch; No_of_poles: 3; Outgoing_elbow: 180°; Solder_pin_length_mm: 1.5 mm; Contact_material: CuSn; Contact_surface: tinned; Insulating_material: LCP GF; UL_94_flammability_rating: V-0; Rated_voltage_for_surge_voltage_class_pollution_degree_II_2: 320 V; Rated_current_min_no_of_poles_TU_20_deg_C: 19 A; Rated_voltage_use_group_B_UL_1059: 300 V; Rated_current_use_group_B_UL_1059: 10 A; PackageReference: SL_SMT_3_5_180LF_03; Colour: Black; Packaging: Box; Qty: 100 PCS; Revision: V1; ComponentLink1Description: Manufacturer URL; ComponentLink1URL: http://www.weidmueller.com/; ComponentLink2Description: URL Link1; ComponentLink2URL: http://catalog.weidmueller.com/catalog/Start.do?localeId=en&ObjectID=1804710000
footprint SL_SMT_3_5_180LF_03 (OMNIMATE Signal - Serie BL/SL 3.50  SL-SMT 3.50/03/180LF 1.5)
part A pins: A1
part B pins: A2
part C pins: A3

## 1804720000
designator J?
OMNIMATE Signal - series BL/SL 3.50; PartNumber: 1804720000; Manufacturer: Weidmueller; Short_text_for_material: SL-SMT 3.50/04/180LF 1.5SN BK BX; Side_termination_characteristic: Solder flange; Mounting_onto_the_PCB: Reflow solder connection; Pitch_mm: 3.5 mm; Pitch_inch: 0.138 inch; No_of_poles: 4; Outgoing_elbow: 180°; Solder_pin_length_mm: 1.5 mm; Contact_material: CuSn; Contact_surface: tinned; Insulating_material: LCP GF; UL_94_flammability_rating: V-0; Rated_voltage_for_surge_voltage_class_pollution_degree_II_2: 320 V; Rated_current_min_no_of_poles_TU_20_deg_C: 19 A; Rated_voltage_use_group_B_UL_1059: 300 V; Rated_current_use_group_B_UL_1059: 10 A; PackageReference: SL_SMT_3_5_180LF_04; Colour: Black; Packaging: Box; Qty: 100 PCS; Revision: V1; ComponentLink1Description: Manufacturer URL; ComponentLink1URL: http://www.weidmueller.com/; ComponentLink2Description: URL Link1; ComponentLink2URL: http://catalog.weidmueller.com/catalog/Start.do?localeId=en&ObjectID=1804720000
footprint SL_SMT_3_5_180LF_04 (OMNIMATE Signal - Serie BL/SL 3.50  SL-SMT 3.50/04/180LF 1.5)
pins: A1, A2, A3, A4

## 1804720000_Single
designator J?
OMNIMATE Signal - series BL/SL 3.50; PartNumber: 1804720000; Manufacturer: Weidmueller; Short_text_for_material: SL-SMT 3.50/04/180LF 1.5SN BK BX; Side_termination_characteristic: Solder flange; Mounting_onto_the_PCB: Reflow solder connection; Pitch_mm: 3.5 mm; Pitch_inch: 0.138 inch; No_of_poles: 4; Outgoing_elbow: 180°; Solder_pin_length_mm: 1.5 mm; Contact_material: CuSn; Contact_surface: tinned; Insulating_material: LCP GF; UL_94_flammability_rating: V-0; Rated_voltage_for_surge_voltage_class_pollution_degree_II_2: 320 V; Rated_current_min_no_of_poles_TU_20_deg_C: 19 A; Rated_voltage_use_group_B_UL_1059: 300 V; Rated_current_use_group_B_UL_1059: 10 A; PackageReference: SL_SMT_3_5_180LF_04; Colour: Black; Packaging: Box; Qty: 100 PCS; Revision: V1; ComponentLink1Description: Manufacturer URL; ComponentLink1URL: http://www.weidmueller.com/; ComponentLink2Description: URL Link1; ComponentLink2URL: http://catalog.weidmueller.com/catalog/Start.do?localeId=en&ObjectID=1804720000
footprint SL_SMT_3_5_180LF_04 (OMNIMATE Signal - Serie BL/SL 3.50  SL-SMT 3.50/04/180LF 1.5)
part A pins: A1
part B pins: A2
part C pins: A3
part D pins: A4

## 1804760000
designator J?
OMNIMATE Signal - series BL/SL 3.50; PartNumber: 1804760000; Manufacturer: Weidmueller; Short_text_for_material: SL-SMT 3.50/08/180LF 1.5SN BK BX; Side_termination_characteristic: Solder flange; Mounting_onto_the_PCB: Reflow solder connection; Pitch_mm: 3.5 mm; Pitch_inch: 0.138 inch; No_of_poles: 8; Outgoing_elbow: 180°; Solder_pin_length_mm: 1.5 mm; Contact_material: CuSn; Contact_surface: tinned; Insulating_material: LCP GF; UL_94_flammability_rating: V-0; Rated_voltage_for_surge_voltage_class_pollution_degree_II_2: 320 V; Rated_current_min_no_of_poles_TU_20_deg_C: 19 A; Rated_voltage_use_group_B_UL_1059: 300 V; Rated_current_use_group_B_UL_1059: 10 A; PackageReference: SL_SMT_3_5_180LF_08; Colour: Black; Packaging: Box; Qty: 50 PCS; Revision: V1; ComponentLink1Description: Manufacturer URL; ComponentLink1URL: http://www.weidmueller.com/; ComponentLink2Description: URL Link1; ComponentLink2URL: http://catalog.weidmueller.com/catalog/Start.do?localeId=en&ObjectID=1804760000
footprint SL_SMT_3_5_180LF_08 (OMNIMATE Signal - Serie BL/SL 3.50  SL-SMT 3.50/08/180LF 1.5)
pins: A1, A2, A3, A4, A5, A6, A7, A8